# Altium footprint library General_Lib.PcbLib: 729 footprints (part 1 of 46)
Each footprint in its own frame and in the unit in brackets; x right, y up, seen from the top. Pads: shape width x height; smd on the part's side, far side on the other; paste and mask are expansions set on the pad; w line width, h text height; cw(c..) or ccw(c..) is an arc to the next point about the centre after c.
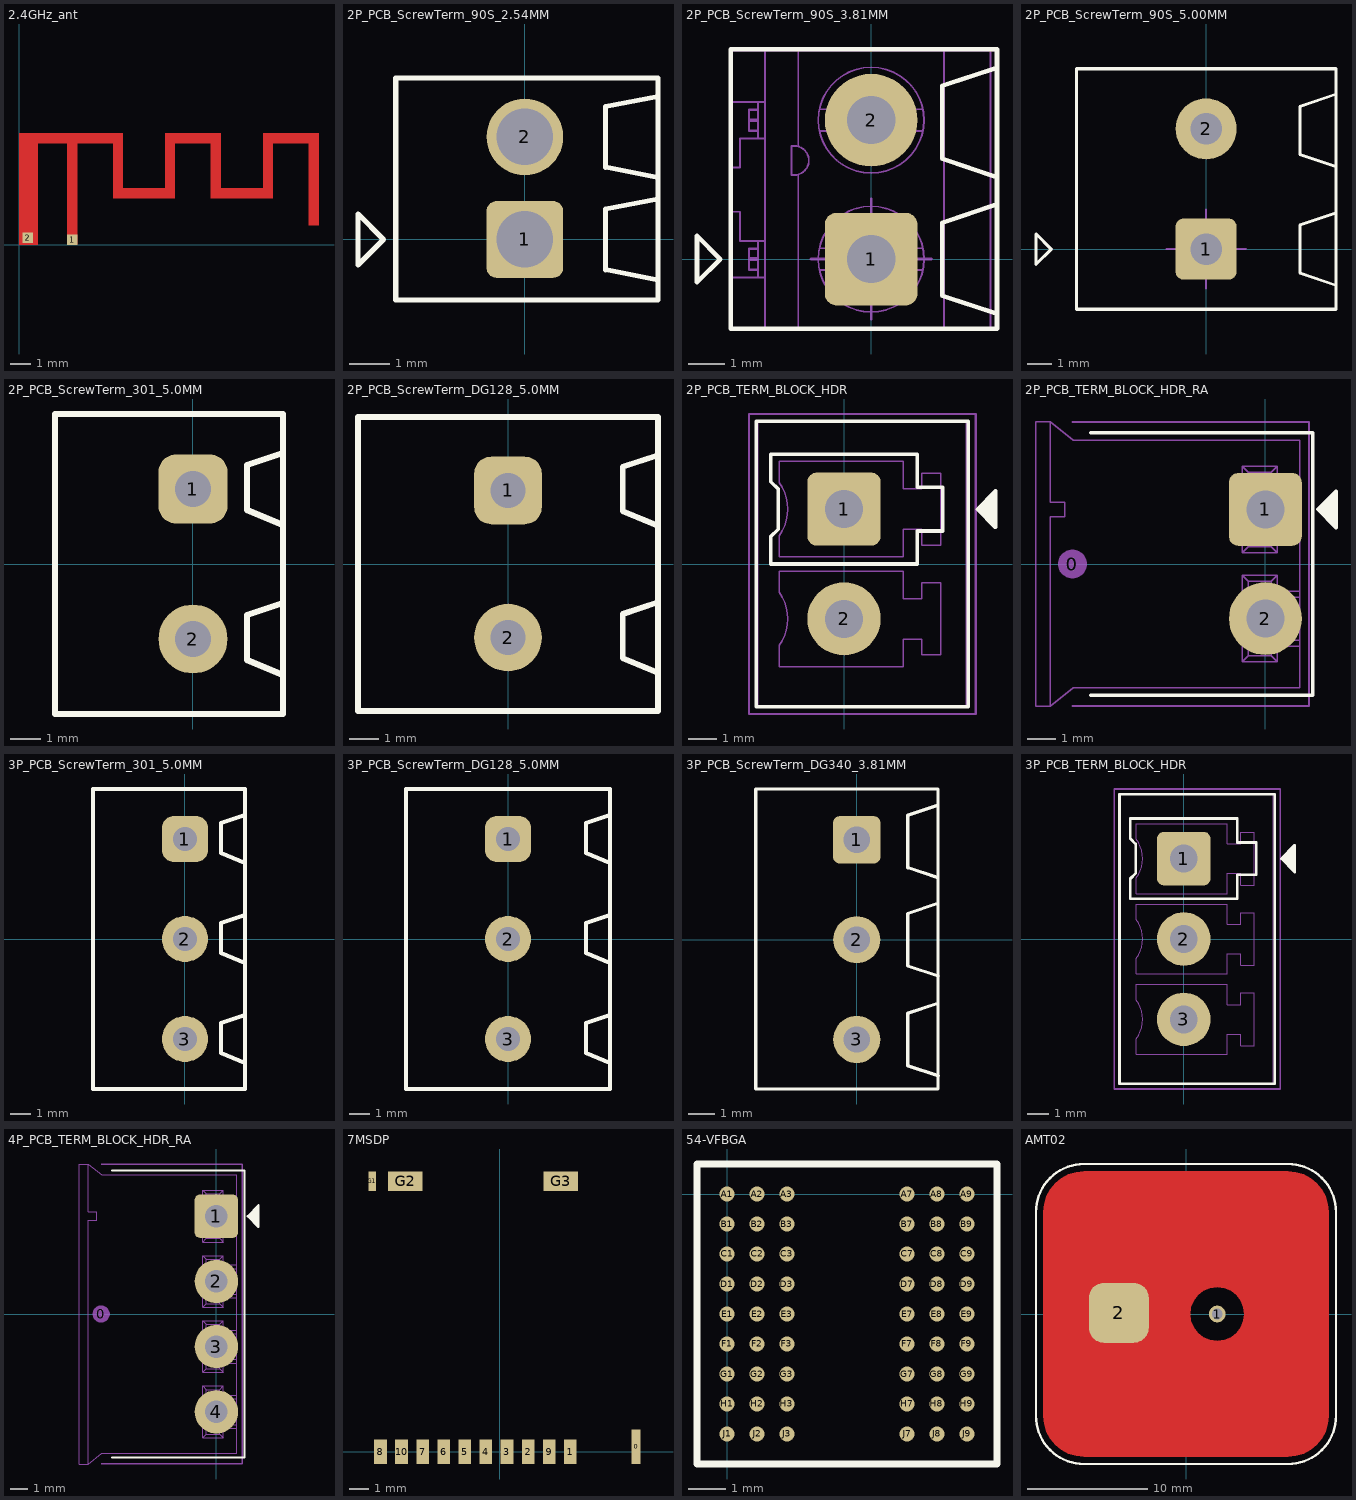
[diagram p0: the footprints below, top view; thin cyan lines are the x and y axes]

## 2.4GHz_ant [mm]
pads (2):
  rect 0.5x0.5 smd paste+0 mask+0: 1(2.55,0.25) 2(0.425,0.35)
Top Layer:
  rectangle: -0.001,4.882 5.001,5.382
  rectangle: 2.301,-0.008 2.801,5.382
  rectangle: 13.901,0.942 14.401,5.382
  rectangle: -0.001,-0.008 0.901,5.382
  rectangle: 7,2.243 7.5,5.382
  rectangle: 11.701,4.882 14.401,5.382
  rectangle: 11.701,2.243 12.199,5.382
  rectangle: 9.199,2.243 12.199,2.743
  rectangle: 4.5,2.243 5.001,5.382
  rectangle: 4.5,2.243 7.5,2.743
  rectangle: 7,4.882 9.7,5.382
  rectangle: 9.199,2.243 9.7,5.382

## 2P_PCB_ScrewTerm_90S_2.54MM [mm] "TERM BLOCK 2POS SIDE ENT STACKABLE 2.54"
height 8.5
pads (2):
  rrect25% 1.9x1.9 hole 1.4: 1(0,0)
  round 1.9 hole 1.4: 2(0,2.54)
Top Overlay:
  lines w0.127: 3.3,-1 2,-0.75 2,0.75 3.3,1 ; 3.3,1.54 2,1.79 2,3.29 3.3,3.54 ; -4.135,-0.635 -4.135,0.635 -3.5,0 -4.135,-0.635 ; -3.2,-1.5 -3.2,4 3.3,4 3.3,-1.5 -3.2,-1.5
3D body "User Library-connector_PTR_AKZ_692.step": height 8.5, standoff -3.5, extent -3.2,-1.495 3.3,4.045

## 2P_PCB_ScrewTerm_90S_3.81MM [mil] "TERM BLOCK 2POS SIDE ENT STACKABLE 3.81MM"
height 334.65
pads (2):
  rrect25% 100x100 hole 52: 1(0,0)
  round 100 hole 52: 2(0,150)
Top Overlay:
  lines w5: 135.83,-59.06 76.78,-39.37 76.78,39.37 135.83,59.06 ; 135.83,88.58 76.78,108.27 76.78,187.01 135.83,206.69 ; -188,-25 -163,0 -188,25 -188,-25 ; -151.57,-75 -151.57,226.38 135.83,226.38 135.83,-75 -151.57,-75
Mechanical 13:
  circle w1.97: c0,0 r57.09
  circle w1.97: c0,150 r57.09
  lines w1.97: -151.57,-19.69 -114.76,-19.69 -114.76,19.68 -141.73,19.68 -141.73,51.18 -151.57,51.18 ; -151.57,98.82 -141.73,98.82 -141.73,130.31 -114.76,130.31 -114.76,169.69 -151.57,169.69 ; -131.89,-10.91 -122.05,-10.91 ; -131.89,-1.06 -122.05,-1.06 ; -131.89,1.06 -122.05,1.06 ; -131.89,10.91 -122.05,10.91 ; -131.89,139.09 -122.05,139.09 ; -131.89,148.94 -122.05,148.94 ; -131.89,151.06 -122.05,151.06 ; -131.89,160.91 -122.05,160.91 ; -122.05,-19.69 -122.05,19.68 ; -122.05,-11.81 -131.89,-11.81 -131.89,11.81 -122.05,11.81 ; -122.05,130.31 -122.05,169.69 ; -122.05,138.19 -131.89,138.19 -131.89,161.81 -122.05,161.81 ; -114.56,-75 -114.56,225 ; -78.74,-75 -78.74,91.34 ; -78.74,121.65 -78.74,225 ; -55.85,-11.81 55.85,-11.81 ; -55.85,11.81 55.85,11.81 ; -55.85,138.19 55.85,138.19 ; -55.85,161.81 55.85,161.81 ; 78.74,-75 78.74,225 ; 128.89,-75 128.89,225 ; -151.57,-75 -151.57,225 135.83,225 135.83,-75 -151.57,-75 ; -85.91,90.75 -83.03,90.75 ccw(c-83.03,106.5) -83.03,122.24 -85.91,122.24 -85.91,90.75
Mechanical 15:
  lines w3: -65,0 65,0 ; 0,-65 0,65
3D body "c-1776113-2-o-3d.stp": height 334.65, standoff -137.8, extent -151.57,-75.19 135.83,224.81

## 2P_PCB_ScrewTerm_90S_5.00MM [mm] "TERM BLOCK 2POS SIDE ENT STACKABLE 5.00MM"
height 13.8
pads (2):
  rrect25% 2.54x2.54 hole 1.3: 1(0,0)
  round 2.54 hole 1.3: 2(0,5)
Top Overlay:
  lines w0.127: 5.396,-1.501 3.896,-1.001 3.896,0.999 5.396,1.499 ; 5.396,3.439 3.896,3.939 3.896,5.939 5.396,6.439 ; -7.075,-0.635 -7.075,0.635 -6.44,0 -7.075,-0.635 ; -5.4,-2.5 5.4,-2.5 5.4,7.5 -5.4,7.5 -5.4,-2.5
Mechanical 15:
  lines w0.076: -1.651,0 1.651,0 ; 0,-1.651 0,1.651

## 2P_PCB_ScrewTerm_301_5.0MM [mm]
height 10
pads (2):
  rrect50% 2.3x2.3 hole 1.2: 1(0,2.5)
  round 2.3 hole 1.2: 2(0,-2.5)
Top Overlay:
  lines w0.2: 3,-3.7 1.8,-3.2 1.8,-1.7 3,-1.3 ; 3,1.3 1.8,1.8 1.8,3.3 3,3.7 ; -4.6,-5 -4.6,5 3,5 3,-5 -4.6,-5
3D body "Terminal-Screw-3A-2way.STEP": height 10, standoff -3, extent -4.6,-5.6 3,5

## 2P_PCB_ScrewTerm_DG128_5.0MM [mm]
height 14
pads (2):
  rrect50% 2.3x2.3 hole 1.2: 1(0,2.5)
  round 2.3 hole 1.2: 2(0,-2.5)
Top Overlay:
  lines w0.2: 5.1,-3.7 3.9,-3.2 3.9,-1.7 5.1,-1.3 ; 5.1,1.3 3.9,1.8 3.9,3.3 5.1,3.7 ; -5.1,-5 -5.1,5 5.1,5 5.1,-5 -5.1,-5
3D body "User Library-DG128-5_0-02P-14.step": height 14.3, standoff -3.5, extent -5.105,-5.305 5.095,4.995

## 2P_PCB_TERM_BLOCK_HDR [mil] "TERM BLOCK HDR 2POS 3.81MM"
height 362.2
pads (2):
  rrect25% 100x100 hole 52: 1(0,75)
  round 100 hole 52: 2(0,-75)
Top Overlay:
  region: 182,75 207,100 207,50
  lines w5: -120,-195.08 -120,195.08 ; -120,-195 170,-195 ; -120,195 170,195 ; 170,-195.08 170,195.08 ; -100,0 100,0 100,45 135,45 135,105 100,105 100,150 -100,150 -100,112.5 -90,102.5 -90,47.5 -100,37.5 -100,0 ; 182,75 207,100 207,50 182,75
Mechanical 13:
  circle w1.97: c0,-75 r43.31
  circle w1.97: c0,75 r43.31
  circle w1.97: c0,75 r35.43
  circle w1.97: c0,-75 r35.43
  lines w1.97: -118.11,-195.08 -118.11,195.08 167.32,195.08 167.32,-195.08 -118.11,-195.08 ; -88.58,-140.16 -88.58,-111.08 ccw(c-137.8,-75) -88.58,-38.92 -88.58,-9.84 80.71,-9.84 80.71,-47.44 106.3,-47.44 106.3,-25.79 131.89,-25.79 131.89,-124.21 106.3,-124.21 106.3,-102.56 80.71,-102.56 80.71,-140.16 -88.58,-140.16 ; -88.58,9.84 -88.58,38.92 ccw(c-137.8,75) -88.58,111.08 -88.58,140.16 80.71,140.16 80.71,102.56 106.3,102.56 106.3,124.21 131.89,124.21 131.89,25.79 106.3,25.79 106.3,47.44 80.71,47.44 80.71,9.84 -88.58,9.84 ; -15.75,-90.75 15.75,-90.75 15.75,-59.25 -15.75,-59.25 -15.75,-90.75 ; -15.75,59.25 15.75,59.25 15.75,90.75 -15.75,90.75 -15.75,59.25
Mechanical 15:
  lines w3: -130,-205 180,-205 180,205 -130,205 -130,-205
3D body "CONN HEADER TE 2P.STEP": height 362.2, standoff -133.86, extent -118.1,-195.07 167.33,195.08

## 2P_PCB_TERM_BLOCK_HDR_RA [mil] "TERM BLOCK HDR 2POS 3.81MM RIGHT-ANGLE"
height 362.2
pads (3):
  round 40 on Mech15: 0(-265,0)
  rrect25% 100x100 hole 52: 1(0,75)
  round 100 hole 52: 2(0,-75)
Top Overlay:
  region: 72,75 97,100 97,50
  lines w5: -240,-180 65,-180 65,180 -240,180 ; 72,75 97,50 97,100 72,75
Mechanical 13:
  lines w1.97: 47.24,-112.8 7.87,-112.8 ; 47.24,-104.53 16.14,-104.53 ; 47.24,-45.47 16.14,-45.47 ; 47.24,-37.2 7.87,-37.2 ; 47.24,37.2 7.87,37.2 ; 47.24,45.47 16.14,45.47 ; 47.24,104.53 16.14,104.53 ; 47.24,112.8 7.87,112.8 ; -295.28,-195.08 -295.28,65.16 -275.59,65.16 -275.59,84.84 -295.28,84.84 -295.28,195.08 ; -295.28,-195.08 -314.96,-195.08 -314.96,195.08 -295.28,195.08 ; -295.28,-195.08 -263.78,-169.88 47.24,-169.88 47.24,169.88 -263.78,169.88 -295.28,195.08 ; -31.89,-134.45 -31.89,-15.55 ; -31.89,-134.45 16.14,-134.45 ; -31.89,-134.45 -23.62,-126.18 ; -31.89,-15.55 16.14,-15.55 ; -31.89,-15.55 -23.62,-23.82 ; -31.89,15.55 -31.89,134.45 ; -31.89,15.55 16.14,15.55 ; -31.89,15.55 -23.62,23.82 ; -31.89,134.45 16.14,134.45 ; -31.89,134.45 -23.62,126.18 ; -23.62,-126.18 -23.62,-23.82 ; -23.62,-126.18 7.87,-126.18 ; -23.62,-23.82 7.87,-23.82 ; -23.62,23.82 -23.62,126.18 ; -23.62,23.82 7.87,23.82 ; -23.62,126.18 7.87,126.18 ; 7.87,-126.18 16.14,-134.45 ; 7.87,-126.18 7.87,-112.8 ; 7.87,-112.8 cw(c16.14,-112.8) 16.14,-104.53 ; 7.87,-37.2 ccw(c16.14,-37.2) 16.14,-45.47 ; 7.87,-37.2 7.87,-23.82 ; 7.87,-23.82 16.14,-15.55 ; 7.87,23.82 16.14,15.55 ; 7.87,23.82 7.87,37.2 ; 7.87,37.2 cw(c16.14,37.2) 16.14,45.47 ; 7.87,112.8 ccw(c16.14,112.8) 16.14,104.53 ; 7.87,112.8 7.87,126.18 ; 7.87,126.18 16.14,134.45 ; 16.14,-134.45 16.14,-104.53 ; 16.14,-45.47 16.14,-15.55 ; 16.14,15.55 16.14,45.47 ; 16.14,104.53 16.14,134.45
Mechanical 15:
  lines w3: -265,-195 60,-195 60,195 -265,195
3D body "CONN RA HEADER TE 2P.STEP": height 291.34, standoff -129.92, extent -314.95,-195.07 47.25,195.08

## 3P_PCB_ScrewTerm_301_5.0MM [mm]
height 10
pads (3):
  rrect50% 2.3x2.3 hole 1.2: 1(0,5)
  round 2.3 hole 1.2: 2(0,0) 3(0,-5)
Top Overlay:
  lines w0.2: 3,-6.2 1.8,-5.7 1.8,-4.2 3,-3.8 ; 3,-1.2 1.8,-0.7 1.8,0.8 3,1.2 ; 3,3.8 1.8,4.3 1.8,5.8 3,6.2 ; -4.6,-7.5 -4.6,7.5 3,7.5 3,-7.5 -4.6,-7.5
3D body "Terminal-Screw-3A-2way.STEP": height 10, standoff -3, extent -4.6,-8.1 3,2.5
3D body "Terminal-Screw-3A-2way.STEP": height 10, standoff -3, extent -4.6,-3.1 3,7.5

## 3P_PCB_ScrewTerm_DG128_5.0MM [mm]
height 14
pads (3):
  rrect50% 2.3x2.3 hole 1.2: 1(0,5)
  round 2.3 hole 1.2: 2(0,0) 3(0,-5)
Top Overlay:
  lines w0.2: 5.1,-6.2 3.9,-5.7 3.9,-4.2 5.1,-3.8 ; 5.1,-1.2 3.9,-0.7 3.9,0.8 5.1,1.2 ; 5.1,3.8 3.9,4.3 3.9,5.8 5.1,6.2 ; -5.1,-7.5 -5.1,7.5 5.1,7.5 5.1,-7.5 -5.1,-7.5
3D body "User Library-DG128-5_0-03P-14.step": height 14.3, standoff -3.5, extent -5.1,-7.8 5.1,7.5

## 3P_PCB_ScrewTerm_DG340_3.81MM [mm] "TERM BLOCK 3POS SIDE ENT STACKABLE 3.81MM"
height 8.4
pads (3):
  rrect25% 1.8x1.8 hole 1: 1(0,3.81)
  round 1.8 hole 1: 2(0,0) 3(0,-3.81)
Top Overlay:
  lines w0.127: 3.06,2.38 1.95,2.75 1.95,4.75 3.09,5.13 ; 3.075,-2.435 1.95,-2.81 1.95,-4.81 3.105,-5.195 ; 3.075,1.375 1.95,1 1.95,-1 3.105,-1.385 ; -3.85,-5.7 3.1,-5.7 3.1,5.75 -3.85,5.75 -3.85,-5.7
3D body "DG340-3.81-03P-12.STEP": height 8.4, standoff -3.1, extent -3.9,-6.195 3.1,5.715

## 3P_PCB_TERM_BLOCK_HDR [mil] "TERM BLOCK HDR 3POS 3.81MM"
height 362.2
pads (3):
  rrect25% 100x100 hole 52: 1(0,150)
  round 100 hole 52: 2(0,0) 3(0,-150)
Top Overlay:
  region: 182,150 207,175 207,125
  lines w5: -120,-270 170,-270 170,270 -120,270 -120,-270 ; -100,75 100,75 100,120 135,120 135,180 100,180 100,225 -100,225 -100,187.5 -90,177.5 -90,122.5 -100,112.5 -100,75 ; 182,150 207,175 207,125 182,150
Mechanical 13:
  circle w1.97: c0,150 r35.43
  circle w1.97: c0,-150 r35.43
  circle w1.97: c0,0 r35.43
  circle w1.97: c0,150 r43.31
  circle w1.97: c0,0 r43.31
  circle w1.97: c0,-150 r43.31
  lines w1.97: -118.11,-270.08 -118.11,270.08 167.32,270.08 167.32,-270.08 -118.11,-270.08 ; -88.58,-215.16 -88.58,-186.08 ccw(c-137.8,-150) -88.58,-113.92 -88.58,-84.84 80.71,-84.84 80.71,-122.44 106.3,-122.44 106.3,-100.79 131.89,-100.79 131.89,-199.21 106.3,-199.21 106.3,-177.56 80.71,-177.56 80.71,-215.16 -88.58,-215.16 ; -88.58,-65.16 80.71,-65.16 80.71,-27.56 106.3,-27.56 106.3,-49.21 131.89,-49.21 131.89,49.21 106.3,49.21 106.3,27.56 80.71,27.56 80.71,65.16 -88.58,65.16 -88.58,36.08 cw(c-137.8,0) -88.58,-36.08 -88.58,-65.16 ; -88.58,84.84 -88.58,113.92 ccw(c-137.8,150) -88.58,186.08 -88.58,215.16 80.71,215.16 80.71,177.56 106.3,177.56 106.3,199.21 131.89,199.21 131.89,100.79 106.3,100.79 106.3,122.44 80.71,122.44 80.71,84.84 -88.58,84.84 ; -15.75,-165.75 15.75,-165.75 15.75,-134.25 -15.75,-134.25 -15.75,-165.75 ; -15.75,-15.75 15.75,-15.75 15.75,15.75 -15.75,15.75 -15.75,-15.75 ; -15.75,134.25 -15.75,165.75 15.75,165.75 15.75,134.25 -15.75,134.25
Mechanical 15:
  lines w3: -130,-280 180,-280 180,280 -130,280 -130,-280
3D body "CONN HEADER TE 3P.STEP": height 362.2, standoff -133.86, extent -118.1,-270.08 167.33,270.08

## 4P_PCB_TERM_BLOCK_HDR_RA [mil] "TERM BLOCK HDR 4POS 3.81MM RIGHT-ANGLE"
height 362.2
pads (5):
  round 40 on Mech15: 0(-265,0)
  rrect25% 100x100 hole 52: 1(0,225)
  round 100 hole 52: 2(0,75) 3(0,-75) 4(0,-225)
Top Overlay:
  region: 72,225 97,250 97,200
  lines w5: -240,-330 65,-330 65,330 -240,330 ; 72,225 97,200 97,250 72,225
Mechanical 13:
  lines w1.97: 47.24,-262.8 7.87,-262.8 ; 47.24,-254.53 16.14,-254.53 ; 47.24,-195.47 16.14,-195.47 ; 47.24,-187.2 7.87,-187.2 ; 47.24,-112.8 7.87,-112.8 ; 47.24,-104.53 16.14,-104.53 ; 47.24,-45.47 16.14,-45.47 ; 47.24,-37.2 7.87,-37.2 ; 47.24,37.2 7.87,37.2 ; 47.24,45.47 16.14,45.47 ; 47.24,104.53 16.14,104.53 ; 47.24,112.8 7.87,112.8 ; 47.24,187.2 7.87,187.2 ; 47.24,195.47 16.14,195.47 ; 47.24,254.53 16.14,254.53 ; 47.24,262.8 7.87,262.8 ; -295.28,-345.08 -263.78,-319.88 47.24,-319.88 47.24,319.88 -263.78,319.88 -295.28,345.08 ; -295.28,-345.08 -295.28,215.16 -275.59,215.16 -275.59,234.84 -295.28,234.84 -295.28,345.08 ; -295.28,-345.08 -314.96,-345.08 -314.96,345.08 -295.28,345.08 ; -31.89,-284.45 -31.89,-165.55 ; -31.89,-284.45 -23.62,-276.18 ; -31.89,-284.45 16.14,-284.45 ; -31.89,-165.55 -23.62,-173.82 ; -31.89,-165.55 16.14,-165.55 ; -31.89,-134.45 -23.62,-126.18 ; -31.89,-134.45 16.14,-134.45 ; -31.89,-134.45 -31.89,-15.55 ; -31.89,-15.55 -23.62,-23.82 ; -31.89,-15.55 16.14,-15.55 ; -31.89,15.55 -23.62,23.82 ; -31.89,15.55 16.14,15.55 ; -31.89,15.55 -31.89,134.45 ; -31.89,134.45 -23.62,126.18 ; -31.89,134.45 16.14,134.45 ; -31.89,165.55 -23.62,173.82 ; -31.89,165.55 16.14,165.55 ; -31.89,165.55 -31.89,284.45 ; -31.89,284.45 -23.62,276.18 ; -31.89,284.45 16.14,284.45 ; -23.62,-276.18 -23.62,-173.82 ; -23.62,-276.18 7.87,-276.18 ; -23.62,-173.82 7.87,-173.82 ; -23.62,-126.18 7.87,-126.18 ; -23.62,-126.18 -23.62,-23.82 ; -23.62,-23.82 7.87,-23.82 ; -23.62,23.82 -23.62,126.18 ; -23.62,23.82 7.87,23.82 ; -23.62,126.18 7.87,126.18 ; -23.62,173.82 -23.62,276.18 ; -23.62,173.82 7.87,173.82 ; -23.62,276.18 7.87,276.18 ; 7.87,-276.18 7.87,-262.8 ; 7.87,-276.18 16.14,-284.45 ; 7.87,-262.8 cw(c16.14,-262.8) 16.14,-254.53 ; 7.87,-187.2 ccw(c16.14,-187.2) 16.14,-195.47 ; 7.87,-187.2 7.87,-173.82 ; 7.87,-173.82 16.14,-165.55 ; 7.87,-126.18 7.87,-112.8 ; 7.87,-126.18 16.14,-134.45 ; 7.87,-112.8 cw(c16.14,-112.8) 16.14,-104.53 ; 7.87,-37.2 ccw(c16.14,-37.2) 16.14,-45.47 ; 7.87,-37.2 7.87,-23.82 ; 7.87,-23.82 16.14,-15.55 ; 7.87,23.82 7.87,37.2 ; 7.87,23.82 16.14,15.55 ; 7.87,37.2 cw(c16.14,37.2) 16.14,45.47 ; 7.87,112.8 ccw(c16.14,112.8) 16.14,104.53 ; 7.87,112.8 7.87,126.18 ; 7.87,126.18 16.14,134.45 ; 7.87,173.82 7.87,187.2 ; 7.87,173.82 16.14,165.55 ; 7.87,187.2 cw(c16.14,187.2) 16.14,195.47 ; 7.87,262.8 ccw(c16.14,262.8) 16.14,254.53 ; 7.87,262.8 7.87,276.18 ; 7.87,276.18 16.14,284.45 ; 16.14,-284.45 16.14,-254.53 ; 16.14,-195.47 16.14,-165.55 ; 16.14,-134.45 16.14,-104.53 ; 16.14,-45.47 16.14,-15.55 ; 16.14,15.55 16.14,45.47 ; 16.14,104.53 16.14,134.45 ; 16.14,165.55 16.14,195.47 ; 16.14,254.53 16.14,284.45
Mechanical 15:
  lines w3: -265,-345 60,-345 60,345 -265,345
3D body "CONN RA HEADER TE 4P.STEP": height 291.34, standoff -129.92, extent -314.95,-345.07 47.25,345.08

## 7MSDP [mm] "SD slot"
height 2.54
pads (14):
  rect 0.45x1.8 smd: 0(7.105,0.254)
  rect 0.66x1.27 smd: 1(3.675,0) 2(1.475,0) 3(0.375,0) 4(-0.725,0) 5(-1.825,0) 6(-2.925,0) 7(-4.025,0) 8(-6.225,0) 9(2.575,0) 10(-5.125,0)
  rect 0.4x1 smd: G1(-6.65,14.1)
  rect 1.8x1 smd: G2(-4.925,14.1) G3(3.175,14.1)
3D body "SD.stp": height 1.95, standoff 0, extent -7,-0.6 7.4,14.6

## 54-VFBGA [mm]
pads (54):
  round 0.4 smd: A1(0,0) A2(0.8,0) A3(1.6,0) A7(4.8,0) A8(5.6,0) A9(6.4,0) B1(0,-0.8) B2(0.8,-0.8) B3(1.6,-0.8) B7(4.8,-0.8) B8(5.6,-0.8) B9(6.4,-0.8) C1(0,-1.6) C2(0.8,-1.6) C3(1.6,-1.6) C7(4.8,-1.6) C8(5.6,-1.6) C9(6.4,-1.6) D1(0,-2.4) D2(0.8,-2.4) D3(1.6,-2.4) D7(4.8,-2.4) D8(5.6,-2.4) D9(6.4,-2.4) E1(0,-3.2) E2(0.8,-3.2) E3(1.6,-3.2) E7(4.8,-3.2) E8(5.6,-3.2) E9(6.4,-3.2) F1(0,-4) F2(0.8,-4) F3(1.6,-4) F7(4.8,-4) F8(5.6,-4) F9(6.4,-4) G1(0,-4.8) G2(0.8,-4.8) G3(1.6,-4.8) G7(4.8,-4.8) G8(5.6,-4.8) G9(6.4,-4.8) H1(0,-5.6) H2(0.8,-5.6) H3(1.6,-5.6) H7(4.8,-5.6) H8(5.6,-5.6) H9(6.4,-5.6) J1(0,-6.4) J2(0.8,-6.4) J3(1.6,-6.4) J7(4.8,-6.4) J8(5.6,-6.4) J9(6.4,-6.4)
Top Overlay:
  lines w0.2: -0.8,-7.2 -0.8,0.8 7.2,0.8 7.2,-7.2 -0.8,-7.2
3D body "vfbga54.stp": height 1, standoff 0, extent -0.8,-7.2 7.2,0.8

## AMT02 [mm]
height 0.001
pads (2):
  round 1.4 hole 0.9: 1(2.6,0)
  rrect50% 5x5 smd: 2(-5.6,0.1)
Top Layer:
  region: 9.162,11.826 9.798,11.633 10.384,11.319 10.898,10.898 11.319,10.384 11.633,9.798 11.826,9.162 11.89,8.509 11.888,8.5 11.888,-8.5 11.89,-8.509 11.826,-9.162 11.633,-9.798 11.319,-10.384 10.898,-10.898 10.384,-11.319 9.798,-11.633 9.162,-11.826 8.509,-11.89 8.5,-11.888 -8.5,-11.888 -8.509,-11.89 -9.162,-11.826 -9.798,-11.633 -10.384,-11.319 -10.898,-10.898 -11.319,-10.384 -11.633,-9.798 -11.826,-9.162 -11.89,-8.509 -11.888,-8.5 -11.888,8.5 -11.89,8.509 -11.826,9.162 -11.633,9.798 -11.319,10.384 -10.898,10.898 -10.384,11.319 -9.798,11.633 -9.162,11.826 -8.509,11.89 -8.5,11.888 8.5,11.888 8.509,11.89 hole: 2.6,2.219 2.026,2.143 1.491,1.922 1.031,1.569 0.678,1.109 0.457,0.574 0.381,0 0.457,-0.574 0.678,-1.109 1.031,-1.569 1.491,-1.922 2.026,-2.143 2.6,-2.219 3.174,-2.143 3.709,-1.922 4.169,-1.569 4.522,-1.109 4.743,-0.574 4.819,0 4.743,0.574 4.522,1.109 4.169,1.569 3.709,1.922 3.174,2.143
Top Overlay:
  lines w0.2: -12.5,-8.5 ccw(c-8.5,-8.5) -8.5,-12.5 8.5,-12.5 ccw(c8.5,-8.5) 12.5,-8.5 12.5,8.5 ccw(c8.5,8.5) 8.5,12.5 -8.5,12.5 ccw(c-8.5,8.5) -12.5,8.5 -12.5,-8.5
3D body "GPS_ant.step": height 5, standoff -3, extent -12.5,-12.5 12.5,12.5